# Altium schematic symbol library SCHLIB.SchLib: 2608 symbols (part 1 of 20) (continued)
## CAE-330UF-Radial-63V (continued)
CAP ALUM 330UF 20% 63V SMD; Manufacturer: Nichicon; Manufacturer Part Number: UUG1J331MNQ6MS; Ripple Current: 680mA; Life (Hours): 2000Hour; Leakage Current: 4uA; Washability: OK; Supplier 1: Digi-Key; Supplier Part Number 1: 493-7427-1-ND; Stock 1: 133; Pricing 1: 1=1.25000, 10=0.98600 (USD); RoHS: Yes; Mount: Surface Mount; Min Operating Temperature: -40°C; Max Operating Temperature: 85°C; Capacitance: 330uF; Package Quantity: 1; Packaging: Tape and Reel; Voltage Rating (DC): 63V; Tolerance: 20%; Termination: SMD/SMT; Length: 21mm; Height - Seated (Max): 0.866inch; ComponentLink1URL: https://datasheet.ciiva.com/6316/e-ug-6316181.pdf?src-supplier=Digi-Key; ComponentLink1Description: https://datasheet.ciiva.com/6316/e-ug-6316181.pdf?src-supplier=Digi-Key; ComponentLink2URL: https://datasheet.ciiva.com/6316/e-ug-6316175.pdf?src-supplier=Digi-Key; ComponentLink2Description: https://datasheet.ciiva.com/6316/e-ug-6316175.pdf?src-supplier=Digi-Key
footprint C-E-12.5X21L
pins: 1, 2
text: +

## CAE-680UF-RADIAL SMD
designator C?, comment 680UF  Voltage: 50V
CAP ALUM 680UF 20% 50V SMD; Manufacturer: Vishay BCcomponents; Manufacturer Part Number: MAL214699109E3; Ripple Current: 1.3A; Polarity: Polar; Leakage Current: 340uA; Life (Hours): 5000Hour; Impedance: 72mR; Lead Diameter: 1.3mm; ComponentLink1URL: http://www.farnell.com/datasheets/1800489.pdf; ComponentLink1Description: http://www.farnell.com/datasheets/1800489.pdf; ComponentLink2URL: http://components.arrow.com/part/dataview/41790773S9646858N1386; ComponentLink2Description: http://components.arrow.com/part/dataview/41790773S9646858N1386; ComponentLink3URL: http://nichicon-us.com/english/products/pdfs/e-ucl.pdf; ComponentLink3Description: http://nichicon-us.com/english/products/pdfs/e-ucl.pdf; ComponentLink4URL: http://www.farnell.com/datasheets/2059678.pdf; ComponentLink4Description: http://www.farnell.com/datasheets/2059678.pdf; ComponentLink5URL: http://uk.rs-online.com/webdocs/0df0/0900766b80df09a1.pdf; ComponentLink5Description: http://uk.rs-online.com/webdocs/0df0/0900766b80df09a1.pdf; ComponentLink6URL: http://www.farnell.com/datasheets/2244690.pdf; ComponentLink6Description: http://www.farnell.com/datasheets/2244690.pdf; ComponentLink7URL: https://www.alliedelec.com/m/d/f9a8f3530578bb19547681b1320b60ff.pdf; ComponentLink7Description: https://www.alliedelec.com/m/d/f9a8f3530578bb19547681b1320b60ff.pdf; ComponentLink8URL: http://industrial.panasonic.com/www-data/pdf/ABA0000/ABA0000CE114.pdf; ComponentLink8Description: http://industrial.panasonic.com/www-data/pdf/ABA0000/ABA0000CE114.pdf; ComponentLink9URL: https://www.distrelec.biz/Web/Downloads/_t/ds/fp_eng_tds.pdf?mime=application%2Fpdf; ComponentLink9Description: https://www.distrelec.biz/Web/Downloads/_t/ds/fp_eng_tds.pdf?mime=application%2Fpdf; Supplier 1: Arrow Electronics; Stock 1: 2400; Pricing 1: 600=1.58740, 900=1.54700, 1500=1.49630, 3000=1.45580, 4500=1.44550, 150=1.81500, 450=1.54600, 900=1.52090, 1500=1.47100, 3000=1.43100, 4500=1.42100, 1=2.68700, 10=2.61600, 25=2.49300 (USD); RoHS: Yes; Mount: Surface Mount,PCB; Case/Package: Radial; Min Operating Temperature: -55°C; Max Operating Temperature: 125°C; Capacitance: 680uF; Tolerance: 20%; Voltage Rating (DC): 50V; Termination: SMD/SMT; Package Quantity: 150; Voltage Rating: 50V; Packaging: Tape and Reel; Diameter: 16mm; Width: 16mm; Height: 16mm; Lead Pitch: 6.5mm; Height - Seated (Max): 0.63inch; Radiation Hardening: No; ComponentLink10URL: https://datasheet.ciiva.com/11782/0900766b81003e87-11782469.pdf?src-supplier=RSComponents; ComponentLink10Description: https://datasheet.ciiva.com/11782/0900766b81003e87-11782469.pdf?src-supplier=RSComponents; ComponentLink11URL: https://datasheet.ciiva.com/119/146cti-119936.pdf?src-supplier=Digi-Key; ComponentLink11Description: https://datasheet.ciiva.com/119/146cti-119936.pdf?src-supplier=Digi-Key; ComponentLink12URL: https://datasheet.ciiva.com/119/146cti-119934.pdf?src-supplier=Digi-Key; ComponentLink12Description: https://datasheet.ciiva.com/119/146cti-119934.pdf?src-supplier=Digi-Key; ComponentLink13URL: https://datasheet.ciiva.com/11697/146cti-11697685.pdf?src-supplier=Avnet; ComponentLink13Description: https://datasheet.ciiva.com/11697/146cti-11697685.pdf?src-supplier=Avnet; ComponentLink14URL: https://datasheet.ciiva.com/5360/146cti-247382-5360150.pdf?src-supplier=Mouser; ComponentLink14Description: https://datasheet.ciiva.com/5360/146cti-247382-5360150.pdf?src-supplier=Mouser; ComponentLink15URL: https://datasheet.ciiva.com/119/146cti-119935.pdf?src-supplier=Digi-Key; ComponentLink15Description: https://datasheet.ciiva.com/119/146cti-119935.pdf?src-supplier=Digi-Key; Supplier Part Number 1: MAL214699109E3
footprint C-E-16x16x17.5 (Aluminum Electrolytic Capacitor, Body 16.60x16.60x17.50mm, IPC Medium Density)
pins: 1, 2
text: +

## CAE-1000UF-16X27X7.5
designator C?, comment 1000UF  Case/Package: 16X27X7.5  Voltage: 63V
CAP ALUM 1000UF 20% 63V RADIAL; Manufacturer: Nichicon; Manufacturer Part Number: UVR1J102MHD; Dielectric Material: Aluminium; Capacitance: 1mF; Ripple Current: 1.3A; Life (Hours): 2000Hour; Leakage Current: 1.89mA; Dissipation Factor: 0.1%; Lead Diameter: 0.8mm; Washability: OK; Number of I/Os: 8; Supplier 1: Digi-Key; Stock 1: 14682; Pricing 1: 1=0.96, 10=0.759, 100=0.569, 500=0.42994, 1000=0.37935, 2500=0.35406, 5000=0.34142 (USD); Mount: PCB,Through Hole; Number of Pins: 2; Contact Plating: Matte,Tin; Min Operating Temperature: -40°C; Max Operating Temperature: 85°C; Tolerance: 20%; Voltage Rating (DC): 63V; Termination: Radial; Voltage Rating: 63V; Packaging: Bulk; Package Quantity: 50; Diameter: 16mm; Length: 25mm; Height: 25mm; Lead Pitch: 7.5mm; Height - Seated (Max): 0.984inch; Radiation Hardening: No; Lead Free: Lead Free; REACH SVHC: No SVHC; ComponentLink1URL: http://nichicon-us.com/english/products/pdfs/e-mi_tape.pdf?src-supplier=Digi-Key; ComponentLink1Description: http://nichicon-us.com/english/products/pdfs/e-mi_tape.pdf?src-supplier=Digi-Key; ComponentLink2URL: https://www.verical.com/server-webapp/html/getDatasheet?partID=72219&src-supplier=Verical; ComponentLink2Description: https://www.verical.com/server-webapp/html/getDatasheet?partID=72219&src-supplier=Verical; ComponentLink3URL: http://www.mouser.com/ds/2/293/e-uvr-1076495.pdf?src-supplier=Mouser; ComponentLink3Description: http://www.mouser.com/ds/2/293/e-uvr-1076495.pdf?src-supplier=Mouser; ComponentLink4URL: http://www.jameco.com/Jameco/Products/ProdDS/608964.pdf?src-supplier=Jameco; ComponentLink4Description: http://www.jameco.com/Jameco/Products/ProdDS/608964.pdf?src-supplier=Jameco; ComponentLink5URL: http://components.arrow.com/part/dataview/41714517S7196225N1432?src-supplier=Arrow; ComponentLink5Description: http://components.arrow.com/part/dataview/41714517S7196225N1432?src-supplier=Arrow; ComponentLink6URL: http://www.alliedelec.com/m/d/2079ee50b23aa24d1fe62a3e164465c7.pdf?src-supplier=Allied+Electronics; ComponentLink6Description: http://www.alliedelec.com/m/d/2079ee50b23aa24d1fe62a3e164465c7.pdf?src-supplier=Allied+Electronics; ComponentLink7URL: http://products.nichicon.co.jp/en/pdf/XJA043/e-vr.pdf?src-supplier=Future+Electronics; ComponentLink7Description: http://products.nichicon.co.jp/en/pdf/XJA043/e-vr.pdf?src-supplier=Future+Electronics; ComponentLink8URL: http://www.nichicon.co.jp/english/products/pdfs/e-vr.pdf?src-supplier=Avnet; ComponentLink8Description: http://www.nichicon.co.jp/english/products/pdfs/e-vr.pdf?src-supplier=Avnet; Supplier Part Number 1: 493-1129-ND; Stock: 1976; Pricing: 1=1.6, 10=1.428, 25=1.3552, 100=1.0406, 250=0.9196, 500=0.8712, 1000=0.6776 (USD); RoHS: No; ComponentLink9URL: http://www.ti.com/lit/ds/symlink/tca6408a-q1.pdf?src-supplier=Digi-Key; ComponentLink9Description: http://www.ti.com/lit/ds/symlink/tca6408a-q1.pdf?src-supplier=Digi-Key; ComponentLink10URL: http://www.ti.com/general/docs/suppproductinfo.tsp?distId=10&amp;gotoUrl=http%3A%2F%2Fwww.ti.com%2Flit%2Fgpn%2Ftca6408a-q1&src-supplier=Digi-Key; ComponentLink10Description: http://www.ti.com/general/docs/suppproductinfo.tsp?distId=10&amp;gotoUrl=http%3A%2F%2Fwww.ti.com%2Flit%2Fgpn%2Ftca6408a-q1&src-supplier=Digi-Key
footprint C-16X27X7.5
pins: 1, 2
text: +

## CAE-1000uF-RADIAL
designator C?, comment 1000uF  Voltage: 50V
CAP ALUM 1000UF 20% 50V SMD; Manufacturer: Cornell Dubilier; Manufacturer Part Number: AFK108M50P44T-F; Dielectric Material: Aluminium; Dissipation Factor: 0.1%; Capacitance: 1mF; Ripple Current: 1.61A; ESR (Equivalent Series Resistance): 73mR; Life (Hours): 5000Hour; Leakage Current: 500uA; Supplier 1: Digi-Key; Supplier Part Number 1: 338-2150-1-ND; Stock: 4964; Pricing: 1=2.9, 10=2.343, 50=2.0448 (USD); RoHS: Yes; Mount: Surface Mount; Case/Package: Radial; Number of Pins: 2; Min Operating Temperature: -55°C; Max Operating Temperature: 105°C; Tolerance: 20%; Packaging: Tape and Reel; Ripple Current (AC): 1.61A; Voltage Rating: 50V; Voltage Rating (DC): 50V; Package Quantity: 1; Impedance: 73mR; Termination: SMD/SMT; Diameter: 16mm; Length: 16.5mm; Height: 16.5mm; Lead Pitch: 6.7mm; Height - Seated (Max): 0.65inch; Radiation Hardening: No; Lead Free: Lead Free; REACH SVHC: No SVHC; ComponentLink1URL: https://datasheet.ciiva.com/100/afk-100025.pdf?src-supplier=Digi-Key; ComponentLink1Description: https://datasheet.ciiva.com/100/afk-100025.pdf?src-supplier=Digi-Key; ComponentLink2URL: https://datasheet.ciiva.com/100/afk-100026.pdf?src-supplier=Digi-Key; ComponentLink2Description: https://datasheet.ciiva.com/100/afk-100026.pdf?src-supplier=Digi-Key; ComponentLink3URL: https://datasheet.ciiva.com/28458/1856883-28458744.pdf?src-supplier=Element14; ComponentLink3Description: https://datasheet.ciiva.com/28458/1856883-28458744.pdf?src-supplier=Element14; ComponentLink4URL: https://datasheet.ciiva.com/100/afk-100027.pdf?src-supplier=Digi-Key; ComponentLink4Description: https://datasheet.ciiva.com/100/afk-100027.pdf?src-supplier=Digi-Key; ComponentLink5URL: https://datasheet.ciiva.com/8063/1856883-8063758.pdf?src-supplier=Element14; ComponentLink5Description: https://datasheet.ciiva.com/8063/1856883-8063758.pdf?src-supplier=Element14
pins: 1, 2
text: +

## CAE-1500UF-19X19X22MM
designator C?, comment 1500UF  Case/Package: 19X19X22  Voltage Rating: 50V
CAP ALUM 1500UF 20% 50V SMD; Manufacturer: Rubycon; Manufacturer Part Number: 50TRV1500M18X21.5; Capacitance: 1.5mF; Polarity: Polar; Ripple Current: 990mA; Impedance: 72mR; Life (Hours): 10000Hour; Ripple Current (AC): 1.65A; Washability: OK; Supplier 1: Digi-Key; Stock 1: 4100; Pricing 1: 1=3.73, 10=3.01 (USD); Mount: Surface Mount; Min Operating Temperature: -40°C; Max Operating Temperature: 105°C; Packaging: Cut Tape; ESR (Equivalent Series Resistance): 72mR; Tolerance: 20%; Voltage Rating (DC): 50V; Diameter: 18mm; Height: 21.5mm; Height - Seated (Max): 0.866inch; REACH SVHC: Unknown; Supplier Part Number 1: 1189-3575-6-ND
pins: 1, 2
text: +

## CAE-2200UF-RADIAL TH
designator C?, comment 2200UF  Case/Package: Radial  Voltage Rating: 63V
CAP ALUM 2200UF 63V 20% RADIAL; Manufacturer: Nichicon; Manufacturer Part Number: UVK1J222MHD; Capacitance: 2.2mF; Ripple Current: 2.3A; Leakage Current: 4.158mA; Life (Hours): 2000Hour; Lead Diameter: 0.8mm; Dielectric Material: Aluminium; Dissipation Factor: 0.1%; Washability: OK; ComponentLink1URL: http://www.nichicon.co.jp/english/products/pdfs/e-vr.pdf; ComponentLink1Description: http://www.nichicon.co.jp/english/products/pdfs/e-vr.pdf; ComponentLink2URL: http://nichicon-us.com/english/products/pdfs/e-mi_tape.pdf; ComponentLink2Description: http://nichicon-us.com/english/products/pdfs/e-mi_tape.pdf; ComponentLink3URL: http://components.arrow.com/part/dataview/41714523S7264371N1432; ComponentLink3Description: http://components.arrow.com/part/dataview/41714523S7264371N1432; ComponentLink4URL: http://www.alliedelec.com/m/d/2079ee50b23aa24d1fe62a3e164465c7.pdf; ComponentLink4Description: http://www.alliedelec.com/m/d/2079ee50b23aa24d1fe62a3e164465c7.pdf; ComponentLink5URL: http://products.nichicon.co.jp/en/pdf/XJA043/e-vr.pdf; ComponentLink5Description: http://products.nichicon.co.jp/en/pdf/XJA043/e-vr.pdf; ComponentLink6URL: https://www.verical.com/server-webapp/html/getDatasheet?partID=54724; ComponentLink6Description: https://www.verical.com/server-webapp/html/getDatasheet?partID=54724; Supplier 1: Digi-Key; Supplier Part Number 1: 493-12411-ND; Stock 1: 393; Pricing 1: 1=2.11, 10=1.705, 100=1.3023, 500=0.9922, 1000=0.86818, 2500=0.83718, 5000=0.80617 (USD); Mount: Through Hole; Min Operating Temperature: -40°C; Max Operating Temperature: 85°C; Tolerance: 20%; Packaging: Bulk; Package Quantity: 50; Voltage Rating (DC): 63V; Termination: Radial; Features: General Purpose; Diameter: 18mm; Length: 35.5mm; Height: 35.5mm; Lead Pitch: 7.5mm; Height - Seated (Max): 1.476inch; Radiation Hardening: No; ComponentLink7URL: http://www.nichicon.co.jp/english/products/pdfs/e-vk.pdf; ComponentLink7Description: http://www.nichicon.co.jp/english/products/pdfs/e-vk.pdf; ComponentLink8URL: http://www.mouser.com/ds/2/293/e-uvk-880083.pdf; ComponentLink8Description: http://www.mouser.com/ds/2/293/e-uvk-880083.pdf; Supplier 2: Digi-Key; Supplier Part Number 2: 493-1130-ND; Stock 2: 148; Pricing 2: 1=2.06, 10=1.663, 100=1.2703, 500=0.96784, 1000=0.84687, 2500=0.81662, 5000=0.78638 (USD); Weight: 0.01lb; Contact Plating: Matte,Tin; Voltage: 63V; Width: 0.75inch; REACH SVHC: No SVHC; Lead Free: Lead Free
pins: 1, 2
text: +

## CAP-100U-SMD-10.3X10.3
designator C?, comment 100U  Case/Package: Radial  Voltage Rating: 50V
CAP ALUM POLY 100UF 20% 50V SMD; Manufacturer: Panasonic; Manufacturer Part Number: EEHZA1H101V; ESR (Equivalent Series Resistance): 28mR; Life (Hours): 10000Hour; Washability: OK; ComponentLink1URL: http://www.farnell.com/datasheets/2368699.pdf?src-supplier=Farnell; ComponentLink1Description: http://www.farnell.com/datasheets/2368699.pdf?src-supplier=Farnell; ComponentLink2URL: http://nichicon-us.com/english/products/pdfs/e-gya.pdf?src-supplier=Digi-Key; ComponentLink2Description: http://nichicon-us.com/english/products/pdfs/e-gya.pdf?src-supplier=Digi-Key; Supplier 1: Digi-Key; Supplier Part Number 1: P19827CT-ND; Stock 1: 4062; Pricing 1: 1=2.22000, 10=1.79500, 100=1.37050 (USD); RoHS: Yes; Mount: Surface Mount; Min Operating Temperature: -55°C; Max Operating Temperature: 105°C; Composition: Hybrid; Packaging: Tape and Reel; Capacitance: 100uF; Tolerance: 20%; Ratings: AEC-Q200; ComponentLink3URL: https://industrial.panasonic.com/cdbs/www-data/pdf/RDD0000/ABA0000C1221.pdf?src-supplier=Digi-Key; ComponentLink3Description: https://industrial.panasonic.com/cdbs/www-data/pdf/RDD0000/ABA0000C1221.pdf?src-supplier=Digi-Key
footprint C-E-10.3x10.3x10.5
pins: 1, 2
text: +

## CC-0.1pF-0402-50V-±0.1pF%
designator C?, comment Voltage - Rated: 50V  Package: 0402  (hidden comment: 0.1pF)
CAP CER 0.1PF 50V NP0 0402; Manufacturer Part Number: GCM1555C1HR10BA16D; Manufacturer: Murata Electronics; Temperature Coefficient: C0G; Object  Type: Part; Design Item ID: CC-0.1pF-0402-50V-±0.1pF%; Series: GCM; Tolerance: ±0.1pF; Operating Temperature: -55°C ~ 125°C; Features: -; Ratings: AEC-Q200; Applications: Automotive; Failure Rate: -; Mounting Type: Surface Mount, MLCC; Size: 1.00mm x 0.50mm; Height: -; Thickness: 0.55mm; Category: Capacitor; Value: 0.1pF
footprint CC0402
pins: 1, 2

## CC-0.8pF-0402-50V-±0.1pF
designator C?, comment Voltage - Rated: 50V  Package: 0402  (hidden comment: 0.8pF)
CAP CER 0.8PF 50V NP0 0402; Manufacturer Part Number: GCM1555C1HR80BA16D; Manufacturer: Murata Electronics; Tolerance: ±0.1pF; Temperature Coefficient: C0G; Object  Type: Part; Design Item ID: CC-0.8pF-0402-50V-±0.1pF; Series: GCM; Operating Temperature: -55°C ~ 125°C; Features: -; Ratings: AEC-Q200; Applications: Automotive; Failure Rate: -; Mounting Type: Surface Mount, MLCC; Size: 1.00mm x 0.50mm; Height: -; Thickness: 0.55mm; Category: Capacitor; Value: 0.8pF
footprint CC0402
pins: 1, 2

## CC-1.2nF-0402-50V-±10%
designator C?, comment Voltage - Rated: 50V  Package: 0402  (hidden comment: 1.2nF)
CAP CER 1200PF 50V X7R 0402; Manufacturer Part Number: GCM155R71H122KA37D; Manufacturer: Murata Electronics; Tolerance: ±10%; Temperature Coefficient: C0G; Object  Type: Part; Design Item ID: CC-1.2nF-0402-50V-±10%; Series: GCM; Operating Temperature: -55°C ~ 125°C; Features: -; Ratings: AEC-Q200; Applications: Automotive; Failure Rate: -; Mounting Type: Surface Mount, MLCC; Size: 1.00mm x 0.50mm; Height: -; Thickness: 0.55mm; Category: Capacitor; Value: 1.2nF
footprint CC0402
pins: 1, 2

## CC-1.2nF-0603-50V-±1%
designator C?, comment Voltage - Rated: 50V  Package: 0603  (hidden comment: 1.2nF)
CAP CER 1200PF 100V C0G/NP0 0603; Manufacturer Part Number: GCM1885C1H122FA16D; Manufacturer: Murata Electronics; Tolerance: ±1%; Temperature Coefficient: C0G; Object  Type: Part; Design Item ID: CC-1.2nF-0603-50V-±1%; Series: GCM; Operating Temperature: -55°C ~ 125°C; Features: -; Ratings: AEC-Q200; Applications: Automotive; Failure Rate: -; Mounting Type: Surface Mount, MLCC; Size: 1.60mm x 0.80mm; Height: -; Thickness: 0.90mm; Category: Capacitor; Value: 1.2nF
footprint CC0603
pins: 1, 2

## CC-1.2pF-0402-50V-±0.1pF
designator C?, comment Voltage - Rated: 50V  Package: 0402  (hidden comment: 1.2pF)
CAP CER 1.2PF 50V C0G/NP0 0402; Manufacturer Part Number: GCM1555C1H1R2BA16D; Manufacturer: Murata Electronics; Tolerance: ±0.1pF; Temperature Coefficient: C0G; Object  Type: Part; Design Item ID: CC-1.2pF-0402-50V-±0.1pF; Series: GCM; Operating Temperature: -55°C ~ 125°C; Features: -; Ratings: AEC-Q200; Applications: Automotive; Failure Rate: -; Mounting Type: Surface Mount, MLCC; Size: 1.00mm x 0.50mm; Height: -; Thickness: 0.55mm; Category: Capacitor; Value: 1.2pF
footprint CC0402
pins: 1, 2

## CC-1.5nF-0402-50V-±10%
designator C?, comment Voltage - Rated: 50V  Package: 0402  (hidden comment: 1.5nF)
CAP CER 1500PF 50V X7R 0402; Manufacturer Part Number: GCM155R71H152KA37D; Manufacturer: Murata Electronics; Tolerance: ±10%; Temperature Coefficient: C0G; Object  Type: Part; Design Item ID: CC-1.5nF-0402-50V-±10%; Series: GCM; Operating Temperature: -55°C ~ 125°C; Features: -; Ratings: AEC-Q200; Applications: Automotive; Failure Rate: -; Mounting Type: Surface Mount, MLCC; Size: 1.00mm x 0.50mm; Height: -; Thickness: 0.55mm; Category: Capacitor; Value: 1.5nF
footprint CC0402
pins: 1, 2

## CC-1.5nF-0603-50V-±1%
designator C?, comment Voltage - Rated: 50V  Package: 0603  (hidden comment: 1.5nF)
CAP CER 1500PF 50V C0G/NP0 0603; Manufacturer Part Number: GCM1885C1H152FA16D; Manufacturer: Murata Electronics; Tolerance: ±1%; Temperature Coefficient: C0G; Object  Type: Part; Design Item ID: CC-1.5nF-0603-50V-±1%; Series: GCM; Operating Temperature: -55°C ~ 125°C; Features: -; Ratings: AEC-Q200; Applications: Automotive; Failure Rate: -; Mounting Type: Surface Mount, MLCC; Size: 1.60mm x 0.80mm; Height: -; Thickness: 0.90mm; Category: Capacitor; Value: 1.5nF
footprint CC0603
pins: 1, 2

## CC-1.5pF-0402-50V-±0.1pF
designator C?, comment Voltage - Rated: 50V  Package: 0402  (hidden comment: 1.5pF)
CAP CER 1.5PF 50V C0G/NP0 0402; Manufacturer Part Number: GCM1555C1H1R5BA16D; Manufacturer: Murata Electronics; Tolerance: ±0.1pF; Temperature Coefficient: C0G; Object  Type: Part; Design Item ID: CC-1.5pF-0402-50V-±0.1pF; Series: GCM; Operating Temperature: -55°C ~ 125°C; Features: -; Ratings: AEC-Q200; Applications: Automotive; Failure Rate: -; Mounting Type: Surface Mount, MLCC; Size: 1.00mm x 0.50mm; Height: -; Thickness: 0.55mm; Category: Capacitor; Value: 1.5pF
footprint CC0402
pins: 1, 2

## CC-1.5pF-0402-50V-±5%
designator C?, comment Voltage - Rated: 50V  Package: 0402  (hidden comment: 1.5pF)
CAP CER 1.5PF 50V C0G/NP0 0402; Manufacturer Part Number: GCM1555C1H1R5JA16D; Manufacturer: Murata Electronics; Tolerance: ±5%; Temperature Coefficient: C0G; Object  Type: Part; Design Item ID: CC-1.5pF-0402-50V-±5%; Series: GCM; Operating Temperature: -55°C ~ 125°C; Features: -; Ratings: AEC-Q200; Applications: Automotive; Failure Rate: -; Mounting Type: Surface Mount, MLCC; Size: 1.00mm x 0.50mm; Height: -; Thickness: 0.55mm; Category: Capacitor; Value: 1.5pF
footprint CC0402
pins: 1, 2

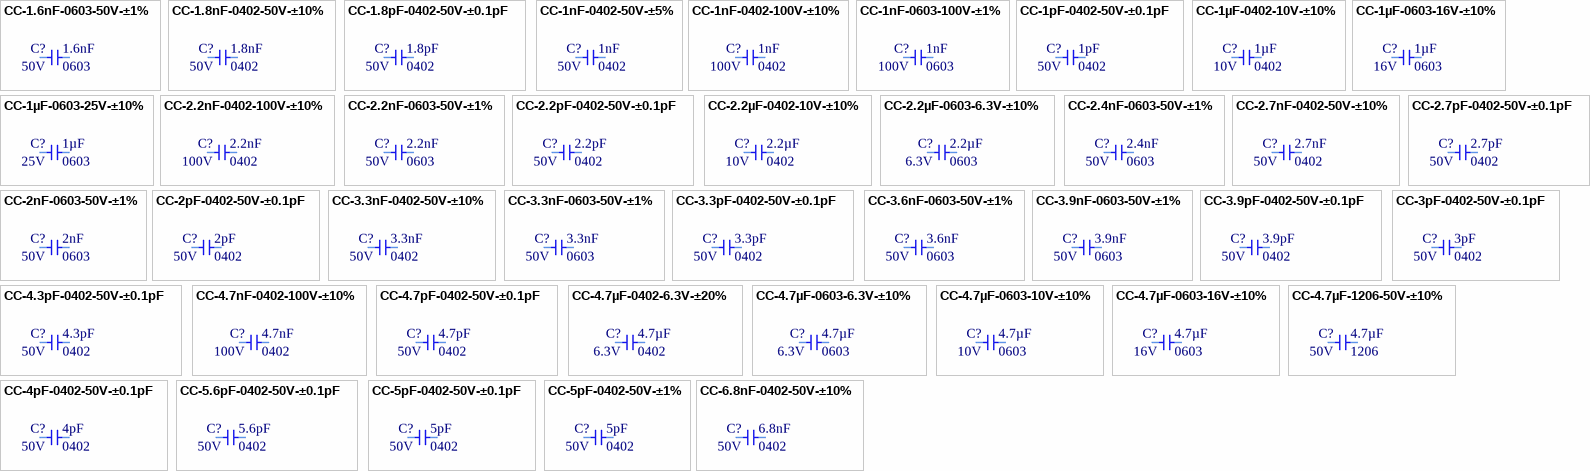
[diagram p1: symbols CC-1.6nF-0603-50V-±1% to CC-6.8nF-0402-50V-±10%]

## CC-1.6nF-0603-50V-±1%
designator C?, comment Voltage - Rated: 50V  Package: 0603  (hidden comment: 1.6nF)
CAP CER 1600PF 50V C0G/NP0 0603; Manufacturer Part Number: GCM1885C1H162FA16D; Manufacturer: Murata Electronics; Tolerance: ±1%; Temperature Coefficient: C0G; Object  Type: Part; Design Item ID: CC-1.6nF-0603-50V-±1%; Series: GCM; Operating Temperature: -55°C ~ 125°C; Features: -; Ratings: AEC-Q200; Applications: Automotive; Failure Rate: -; Mounting Type: Surface Mount, MLCC; Size: 1.60mm x 0.80mm; Height: -; Thickness: 0.90mm; Category: Capacitor; Value: 1.6nF
footprint CC0603
pins: 1, 2

## CC-1.8nF-0402-50V-±10%
designator C?, comment Voltage - Rated: 50V  Package: 0402  (hidden comment: 1.8nF)
CAP CER 1800PF 50V X7R 0402; Manufacturer Part Number: GCM155R71H182KA37D; Manufacturer: Murata Electronics; Tolerance: ±10%; Temperature Coefficient: C0G; Object  Type: Part; Design Item ID: CC-1.8nF-0402-50V-±10%; Series: GCM; Operating Temperature: -55°C ~ 125°C; Features: -; Ratings: AEC-Q200; Applications: Automotive; Failure Rate: -; Mounting Type: Surface Mount, MLCC; Size: 1.00mm x 0.50mm; Height: -; Thickness: 0.55mm; Category: Capacitor; Value: 1.8nF
footprint CC0402
pins: 1, 2

## CC-1.8pF-0402-50V-±0.1pF
designator C?, comment Voltage - Rated: 50V  Package: 0402  (hidden comment: 1.8pF)
CAP CER 1.8PF 50V C0G/NP0 0402; Manufacturer Part Number: GCM1555C1H1R8BA16D; Manufacturer: Murata Electronics; Tolerance: ±0.1pF; Temperature Coefficient: C0G; Object  Type: Part; Design Item ID: CC-1.8pF-0402-50V-±0.1pF; Series: GCM; Operating Temperature: -55°C ~ 125°C; Features: -; Ratings: AEC-Q200; Applications: Automotive; Failure Rate: -; Mounting Type: Surface Mount, MLCC; Size: 1.00mm x 0.50mm; Height: -; Thickness: 0.55mm; Category: Capacitor; Value: 1.8pF
footprint CC0402
pins: 1, 2

## CC-1nF-0402-50V-±5%
designator C?, comment Voltage - Rated: 50V  Package: 0402  (hidden comment: 1nF)
CAP CER 1000PF 50V C0G/NP0 0402; Manufacturer Part Number: GCM1555C1H102JA16J; Manufacturer: Murata Electronics; Tolerance: ±5%; Temperature Coefficient: C0G; Object  Type: Part; Design Item ID: CC-1nF-0402-50V-±5%; Series: GCM; Operating Temperature: -55°C ~ 125°C; Features: -; Ratings: AEC-Q200; Applications: Automotive; Failure Rate: -; Mounting Type: Surface Mount, MLCC; Size: 1.00mm x 0.50mm; Height: -; Thickness: 0.55mm; Category: Capacitor; Value: 1nF
footprint CC0402
pins: 1, 2

## CC-1nF-0402-100V-±10%
designator C?, comment Voltage - Rated: 100V  Package: 0402  (hidden comment: 1nF)
CAP CER 1000PF 100V X7R 0402; Manufacturer Part Number: GCM155R72A102KA37D; Manufacturer: Murata Electronics; Tolerance: ±10%; Temperature Coefficient: C0G; Object  Type: Part; Design Item ID: CC-1nF-0402-100V-±10%; Series: GCM; Operating Temperature: -55°C ~ 125°C; Features: -; Ratings: AEC-Q200; Applications: Automotive; Failure Rate: -; Mounting Type: Surface Mount, MLCC; Size: 1.00mm x 0.50mm; Height: -; Thickness: 0.55mm; Category: Capacitor; Value: 1nF
footprint CC0402
pins: 1, 2

## CC-1nF-0603-100V-±1%
designator C?, comment Voltage - Rated: 100V  Package: 0603  (hidden comment: 1nF)
CAP CER 1000PF 100V C0G/NP0 0603; Manufacturer Part Number: GCM1885C2A102FA16D; Manufacturer: Murata Electronics; Tolerance: ±1%; Temperature Coefficient: C0G; Object  Type: Part; Design Item ID: CC-1nF-0603-100V-±1%; Series: GCM; Operating Temperature: -55°C ~ 125°C; Features: -; Ratings: AEC-Q200; Applications: Automotive; Failure Rate: -; Mounting Type: Surface Mount, MLCC; Size: 1.60mm x 0.80mm; Height: -; Thickness: 0.90mm; Category: Capacitor; Value: 1nF
footprint CC0603
pins: 1, 2

## CC-1pF-0402-50V-±0.1pF
designator C?, comment Voltage - Rated: 50V  Package: 0402  (hidden comment: 1pF)
CAP CER 1PF 50V C0G/NP0 0402; Manufacturer Part Number: GCM1555C1H1R0BA16D; Manufacturer: Murata Electronics; Tolerance: ±0.1pF; Temperature Coefficient: C0G; Object  Type: Part; Design Item ID: CC-1pF-0402-50V-±0.1pF; Series: GCM; Operating Temperature: -55°C ~ 125°C; Features: -; Ratings: AEC-Q200; Applications: Automotive; Failure Rate: -; Mounting Type: Surface Mount, MLCC; Size: 1.00mm x 0.50mm; Height: -; Thickness: 0.55mm; Category: Capacitor; Value: 1pF
footprint CC0402
pins: 1, 2

## CC-1µF-0402-10V-±10%
designator C?, comment Voltage - Rated: 10V  Package: 0402  (hidden comment: 1µF)
CAP CER 1UF 10V X7S 0402; Manufacturer Part Number: GCM155C71A105KE38D; Manufacturer: Murata Electronics; Tolerance: ±10%; Temperature Coefficient: C0G; Object  Type: Part; Design Item ID: CC-1µF-0402-10V-±10%; Series: GCM; Operating Temperature: -55°C ~ 125°C; Features: -; Ratings: AEC-Q200; Applications: Automotive; Failure Rate: -; Mounting Type: Surface Mount, MLCC; Size: 1.00mm x 0.50mm; Height: -; Thickness: 0.55mm; Category: Capacitor; Value: 1µF
footprint CC0402
pins: 1, 2

## CC-1µF-0603-16V-±10%
designator C?, comment Voltage - Rated: 16V  Package: 0603  (hidden comment: 1µF)
CAP CER 1UF 16V X7R 0603; Manufacturer Part Number: GCM188R71C105KA64D; Manufacturer: Murata Electronics; Tolerance: ±10%; Object  Type: Part; Design Item ID: CC-1µF-0603-16V-±10%; Series: GCM; Temperature Coefficient: X7R; Operating Temperature: -55°C ~ 125°C; Features: -; Ratings: AEC-Q200; Applications: Automotive; Failure Rate: -; Mounting Type: Surface Mount, MLCC; Size: 1.60mm x 0.80mm; Height: -; Thickness: 0.90mm; Category: Capacitor; Value: 1µF
footprint CC0603
pins: 1, 2

## CC-1µF-0603-25V-±10%
designator C?, comment Voltage - Rated: 25V  Package: 0603  (hidden comment: 1µF)
CAP CER 1UF 25V X7R 0603; Manufacturer Part Number: GCM188R71E105KA64D; Manufacturer: Murata Electronics; Tolerance: ±10%; Object  Type: Part; Design Item ID: CC-1µF-0603-25V-±10%; Series: GCM; Temperature Coefficient: X7R; Operating Temperature: -55°C ~ 125°C; Features: -; Ratings: AEC-Q200; Applications: Automotive; Failure Rate: -; Mounting Type: Surface Mount, MLCC; Size: 1.60mm x 0.80mm; Height: -; Thickness: 0.90mm; Category: Capacitor; Value: 1µF
footprint CC0603
pins: 1, 2

## CC-2.2nF-0402-100V-±10%
designator C?, comment Voltage - Rated: 100V  Package: 0402  (hidden comment: 2.2nF)
CAP CER 2200PF 100V X7R 0402; Manufacturer Part Number: GCM155R72A222KA37D; Manufacturer: Murata Electronics; Tolerance: ±10%; Temperature Coefficient: C0G; Object  Type: Part; Design Item ID: CC-2.2nF-0402-100V-±10%; Series: GCM; Value: 2.2nF; Operating Temperature: -55°C ~ 125°C; Features: -; Ratings: AEC-Q200; Applications: Automotive; Failure Rate: -; Mounting Type: Surface Mount, MLCC; Size: 1.00mm x 0.50mm; Height: -; Thickness: 0.55mm; Category: Capacitor
footprint CC0402
pins: 1, 2

## CC-2.2nF-0603-50V-±1%
designator C?, comment Voltage - Rated: 50V  Package: 0603  (hidden comment: 2.2nF)
CAP CER 2200PF 50V C0G/NP0 0603; Manufacturer Part Number: GCM1885C1H222FA16D; Manufacturer: Murata Electronics; Tolerance: ±1%; Temperature Coefficient: C0G; Object  Type: Part; Design Item ID: CC-2.2nF-0603-50V-±1%; Series: GCM; Operating Temperature: -55°C ~ 125°C; Features: -; Ratings: AEC-Q200; Applications: Automotive; Failure Rate: -; Mounting Type: Surface Mount, MLCC; Size: 1.60mm x 0.80mm; Height: -; Thickness: 0.90mm; Category: Capacitor; Value: 2.2nF
footprint CC0603
pins: 1, 2

## CC-2.2pF-0402-50V-±0.1pF
designator C?, comment Voltage - Rated: 50V  Package: 0402  (hidden comment: 2.2pF)
CAP CER 2.2PF 50V C0G/NP0 0402; Manufacturer Part Number: GCM1555C1H2R2BA16D; Manufacturer: Murata Electronics; Tolerance: ±0.1pF; Temperature Coefficient: C0G; Object  Type: Part; Design Item ID: CC-2.2pF-0402-50V-±0.1pF; Series: GCM; Operating Temperature: -55°C ~ 125°C; Features: -; Ratings: AEC-Q200; Applications: Automotive; Failure Rate: -; Mounting Type: Surface Mount, MLCC; Size: 1.00mm x 0.50mm; Height: -; Thickness: 0.55mm; Category: Capacitor; Value: 2.2pF
footprint CC0402
pins: 1, 2

## CC-2.2µF-0402-10V-±10%
designator C?, comment Voltage - Rated: 10V  Package: 0402  (hidden comment: 2.2µF)
CAP CER 2.2UF 10V X5R 0402; Manufacturer Part Number: LMK105ABJ225KVHF; Manufacturer: Taiyo Yuden; Tolerance: ±10%; Temperature Coefficient: C0G; Object  Type: Part; Design Item ID: CC-2.2µF-0402-10V-±10%; Series: M; Operating Temperature: -55°C ~ 85°C; Features: -; Ratings: AEC-Q200; Applications: Automotive; Failure Rate: -; Mounting Type: Surface Mount, MLCC; Size: 1.00mm x 0.50mm; Height: -; Thickness: 0.60mm; Category: Capacitor; Value: 2.2µF
footprint CC0402
pins: 1, 2

## CC-2.2µF-0603-6.3V-±10%
designator C?, comment Voltage - Rated: 6.3V  Package: 0603  (hidden comment: 2.2µF)
CAP CER 2.2UF 6.3V X7R 0603; Manufacturer Part Number: GCM188R70J225KE22D; Manufacturer: Murata Electronics; Tolerance: ±10%; Object  Type: Part; Design Item ID: CC-2.2µF-0603-6.3V-±10%; Series: GCM; Temperature Coefficient: X7R; Operating Temperature: -55°C ~ 125°C; Features: -; Ratings: AEC-Q200; Applications: Automotive; Failure Rate: -; Mounting Type: Surface Mount, MLCC; Size: 1.60mm x 0.80mm; Height: -; Thickness: 0.90mm; Category: Capacitor; Value: 2.2µF
footprint CC0603
pins: 1, 2

## CC-2.4nF-0603-50V-±1%
designator C?, comment Voltage - Rated: 50V  Package: 0603  (hidden comment: 2.4nF)
CAP CER 2400PF 50V C0G/NP0 0603; Manufacturer Part Number: GCM1885C1H242FA16J; Manufacturer: Murata Electronics; Tolerance: ±1%; Temperature Coefficient: C0G; Object  Type: Part; Design Item ID: CC-2.4nF-0603-50V-±1%; Series: GCM; Operating Temperature: -55°C ~ 125°C; Features: -; Ratings: AEC-Q200; Applications: Automotive; Failure Rate: -; Mounting Type: Surface Mount, MLCC; Size: 1.60mm x 0.80mm; Height: -; Thickness: 0.90mm; Category: Capacitor; Value: 2.4nF
footprint CC0603
pins: 1, 2

## CC-2.7nF-0402-50V-±10%
designator C?, comment Voltage - Rated: 50V  Package: 0402  (hidden comment: 2.7nF)
CAP CER 2700PF 50V X7R 0402; Manufacturer Part Number: GCM155R71H272KA37D; Manufacturer: Murata Electronics; Tolerance: ±10%; Temperature Coefficient: C0G; Object  Type: Part; Design Item ID: CC-2.7nF-0402-50V-±10%; Series: GCM; Operating Temperature: -55°C ~ 125°C; Features: -; Ratings: AEC-Q200; Applications: Automotive; Failure Rate: -; Mounting Type: Surface Mount, MLCC; Size: 1.00mm x 0.50mm; Height: -; Thickness: 0.55mm; Category: Capacitor; Value: 2.7nF
footprint CC0402
pins: 1, 2

## CC-2.7pF-0402-50V-±0.1pF
designator C?, comment Voltage - Rated: 50V  Package: 0402  (hidden comment: 2.7pF)
CAP CER 2.7PF 50V C0G/NP0 0402; Manufacturer Part Number: GCM1555C1H2R7BA16D; Manufacturer: Murata Electronics; Tolerance: ±0.1pF; Temperature Coefficient: C0G; Object  Type: Part; Design Item ID: CC-2.7pF-0402-50V-±0.1pF; Series: GCM; Operating Temperature: -55°C ~ 125°C; Features: -; Ratings: AEC-Q200; Applications: Automotive; Failure Rate: -; Mounting Type: Surface Mount, MLCC; Size: 1.00mm x 0.50mm; Height: -; Thickness: 0.55mm; Category: Capacitor; Value: 2.7pF
footprint CC0402
pins: 1, 2

## CC-2nF-0603-50V-±1%
designator C?, comment Voltage - Rated: 50V  Package: 0603  (hidden comment: 2nF)
CAP CER 2000PF 50V C0G/NP0 0603; Manufacturer Part Number: GCM1885C1H202FA16J; Manufacturer: Murata Electronics; Tolerance: ±1%; Temperature Coefficient: C0G; Object  Type: Part; Design Item ID: CC-2nF-0603-50V-±1%; Series: GCM; Operating Temperature: -55°C ~ 125°C; Features: -; Ratings: AEC-Q200; Applications: Automotive; Failure Rate: -; Mounting Type: Surface Mount, MLCC; Size: 1.60mm x 0.80mm; Height: -; Thickness: 0.90mm; Category: Capacitor; Value: 2nF
footprint CC0603
pins: 1, 2

## CC-2pF-0402-50V-±0.1pF
designator C?, comment Voltage - Rated: 50V  Package: 0402  (hidden comment: 2pF)
CAP CER 2PF 50V C0G/NP0 0402; Manufacturer Part Number: GCM1555C1H2R0BA16D; Manufacturer: Murata Electronics; Tolerance: ±0.1pF; Temperature Coefficient: C0G; Object  Type: Part; Design Item ID: CC-2pF-0402-50V-±0.1pF; Series: GCM; Value: 2pF; Operating Temperature: -55°C ~ 125°C; Features: -; Ratings: AEC-Q200; Applications: Automotive; Failure Rate: -; Mounting Type: Surface Mount, MLCC; Size: 1.00mm x 0.50mm; Height: -; Thickness: 0.55mm; Category: Capacitor
footprint CC0402
pins: 1, 2

## CC-3.3nF-0402-50V-±10%
designator C?, comment Voltage - Rated: 50V  Package: 0402  (hidden comment: 3.3nF)
CAP CER 3300PF 50V X7R 0402; Manufacturer Part Number: GCM155R71H332KA37D; Manufacturer: Murata Electronics; Tolerance: ±10%; Temperature Coefficient: C0G; Object  Type: Part; Design Item ID: CC-3.3nF-0402-50V-±10%; Series: GCM; Operating Temperature: -55°C ~ 125°C; Features: -; Ratings: AEC-Q200; Applications: Automotive; Failure Rate: -; Mounting Type: Surface Mount, MLCC; Size: 1.00mm x 0.50mm; Height: -; Thickness: 0.55mm; Category: Capacitor; Value: 3.3nF
footprint CC0402
pins: 1, 2

## CC-3.3nF-0603-50V-±1%
designator C?, comment Voltage - Rated: 50V  Package: 0603  (hidden comment: 3.3nF)
CAP CER 3300PF 50V C0G/NP0 0603; Manufacturer Part Number: GCM1885C1H332FA16D; Manufacturer: Murata Electronics; Tolerance: ±1%; Temperature Coefficient: C0G; Object  Type: Part; Design Item ID: CC-3.3nF-0603-50V-±1%; Series: GCM; Operating Temperature: -55°C ~ 125°C; Features: -; Ratings: AEC-Q200; Applications: Automotive; Failure Rate: -; Mounting Type: Surface Mount, MLCC; Size: 1.60mm x 0.80mm; Height: -; Thickness: 0.90mm; Category: Capacitor; Value: 3.3nF
footprint CC0603
pins: 1, 2

## CC-3.3pF-0402-50V-±0.1pF
designator C?, comment Voltage - Rated: 50V  Package: 0402  (hidden comment: 3.3pF)
CAP CER 3.3PF 50V C0G/NP0 0402; Manufacturer Part Number: GCM1555C1H3R3BA16D; Manufacturer: Murata Electronics; Tolerance: ±0.1pF; Temperature Coefficient: C0G; Object  Type: Part; Design Item ID: CC-3.3pF-0402-50V-±0.1pF; Series: GCM; Operating Temperature: -55°C ~ 125°C; Features: -; Ratings: AEC-Q200; Applications: Automotive; Failure Rate: -; Mounting Type: Surface Mount, MLCC; Size: 1.00mm x 0.50mm; Height: -; Thickness: 0.55mm; Category: Capacitor; Value: 3.3pF
footprint CC0402
pins: 1, 2

## CC-3.6nF-0603-50V-±1%
designator C?, comment Voltage - Rated: 50V  Package: 0603  (hidden comment: 3.6nF)
CAP CER 3600PF 50V C0G/NP0 0603; Manufacturer Part Number: GCM1885C1H362FA16J; Manufacturer: Murata Electronics; Tolerance: ±1%; Temperature Coefficient: C0G; Object  Type: Part; Design Item ID: CC-3.6nF-0603-50V-±1%; Series: GCM; Operating Temperature: -55°C ~ 125°C; Features: -; Ratings: AEC-Q200; Applications: Automotive; Failure Rate: -; Mounting Type: Surface Mount, MLCC; Size: 1.60mm x 0.80mm; Height: -; Thickness: 0.90mm; Category: Capacitor; Value: 3.6nF
footprint CC0603
pins: 1, 2

## CC-3.9nF-0603-50V-±1%
designator C?, comment Voltage - Rated: 50V  Package: 0603  (hidden comment: 3.9nF)
CAP CER 3900PF 50V C0G/NP0 0603; Manufacturer Part Number: GCM1885C1H392FA16J; Manufacturer: Murata Electronics; Tolerance: ±1%; Temperature Coefficient: C0G; Object  Type: Part; Design Item ID: CC-3.9nF-0603-50V-±1%; Series: GCM; Operating Temperature: -55°C ~ 125°C; Features: -; Ratings: AEC-Q200; Applications: Automotive; Failure Rate: -; Mounting Type: Surface Mount, MLCC; Size: 1.60mm x 0.80mm; Height: -; Thickness: 0.90mm; Category: Capacitor; Value: 3.9nF
footprint CC0603
pins: 1, 2

## CC-3.9pF-0402-50V-±0.1pF
designator C?, comment Voltage - Rated: 50V  Package: 0402  (hidden comment: 3.9pF)
CAP CER 3.9PF 50V C0G/NP0 0402; Manufacturer Part Number: GCM1555C1H3R9BA16D; Manufacturer: Murata Electronics; Tolerance: ±0.1pF; Temperature Coefficient: C0G; Object  Type: Part; Design Item ID: CC-3.9pF-0402-50V-±0.1pF; Series: GCM; Value: 3.9pF; Operating Temperature: -55°C ~ 125°C; Features: -; Ratings: AEC-Q200; Applications: Automotive; Failure Rate: -; Mounting Type: Surface Mount, MLCC; Size: 1.00mm x 0.50mm; Height: -; Thickness: 0.55mm; Category: Capacitor
footprint CC0402
pins: 1, 2

## CC-3pF-0402-50V-±0.1pF
designator C?, comment Voltage - Rated: 50V  Package: 0402  (hidden comment: 3pF)
CAP CER 3PF 50V C0G/NP0 0402; Manufacturer Part Number: GCM1555C1H3R0BA16D; Manufacturer: Murata Electronics; Tolerance: ±0.1pF; Temperature Coefficient: C0G; Object  Type: Part; Design Item ID: CC-3pF-0402-50V-±0.1pF; Series: GCM; Operating Temperature: -55°C ~ 125°C; Features: -; Ratings: AEC-Q200; Applications: Automotive; Failure Rate: -; Mounting Type: Surface Mount, MLCC; Size: 1.00mm x 0.50mm; Height: -; Thickness: 0.55mm; Category: Capacitor; Value: 3pF
footprint CC0402
pins: 1, 2

## CC-4.3pF-0402-50V-±0.1pF
designator C?, comment Voltage - Rated: 50V  Package: 0402  (hidden comment: 4.3pF)
CAP CER 4.3PF 50V C0G/NP0 0402; Manufacturer Part Number: GCM1555C1H4R3BA16D; Manufacturer: Murata Electronics; Tolerance: ±0.1pF; Temperature Coefficient: C0G; Object  Type: Part; Design Item ID: CC-4.3pF-0402-50V-±0.1pF; Series: GCM; Operating Temperature: -55°C ~ 125°C; Features: -; Ratings: AEC-Q200; Applications: Automotive; Failure Rate: -; Mounting Type: Surface Mount, MLCC; Size: 1.00mm x 0.50mm; Height: -; Thickness: 0.55mm; Category: Capacitor; Value: 4.3pF
footprint CC0402
pins: 1, 2

## CC-4.7nF-0402-100V-±10%
designator C?, comment Voltage - Rated: 100V  Package: 0402  (hidden comment: 4.7nF)
CAP CER 4700PF 100V X7R 0402; Manufacturer Part Number: GCM155R72A472KA37D; Manufacturer: Murata Electronics; Tolerance: ±10%; Temperature Coefficient: C0G; Object  Type: Part; Design Item ID: CC-4.7nF-0402-100V-±10%; Series: GCM; Operating Temperature: -55°C ~ 125°C; Features: -; Ratings: AEC-Q200; Applications: Automotive; Failure Rate: -; Mounting Type: Surface Mount, MLCC; Size: 1.00mm x 0.50mm; Height: -; Thickness: 0.55mm; Category: Capacitor; Value: 4.7nF
footprint CC0402
pins: 1, 2

## CC-4.7pF-0402-50V-±0.1pF
designator C?, comment Voltage - Rated: 50V  Package: 0402  (hidden comment: 4.7pF)
CAP CER 4.7PF 50V C0G/NP0 0402; Manufacturer Part Number: GCM1555C1H4R7BA16D; Manufacturer: Murata Electronics; Tolerance: ±0.1pF; Temperature Coefficient: C0G; Object  Type: Part; Design Item ID: CC-4.7pF-0402-50V-±0.1pF; Series: GCM; Operating Temperature: -55°C ~ 125°C; Features: -; Ratings: AEC-Q200; Applications: Automotive; Failure Rate: -; Mounting Type: Surface Mount, MLCC; Size: 1.00mm x 0.50mm; Height: -; Thickness: 0.55mm; Category: Capacitor; Value: 4.7pF
footprint CC0402
pins: 1, 2

## CC-4.7µF-0402-6.3V-±20%
designator C?, comment Voltage - Rated: 6.3V  Package: 0402  (hidden comment: 4.7µF)
CAP CER 4.7UF 6.3V X5R 0402; Manufacturer Part Number: JMK105BBJ475MVHF; Manufacturer: Taiyo Yuden; Tolerance: ±20%; Temperature Coefficient: C0G; Object  Type: Part; Design Item ID: CC-4.7µF-0402-6.3V-±20%; Series: M; Operating Temperature: -55°C ~ 85°C; Features: -; Ratings: AEC-Q200; Applications: Automotive; Failure Rate: -; Mounting Type: Surface Mount, MLCC; Size: 1.00mm x 0.50mm; Height: -; Thickness: 0.65mm; Category: Capacitor; Value: 4.7µF
footprint CC0402
pins: 1, 2

## CC-4.7µF-0603-6.3V-±10%
designator C?, comment Voltage - Rated: 6.3V  Package: 0603  (hidden comment: 4.7µF)
CAP CER 4.7UF 6.3V X5R 0603; Manufacturer Part Number: JMK107BJ475KAHT; Manufacturer: Taiyo Yuden; Tolerance: ±10%; Object  Type: Part; Design Item ID: CC-4.7µF-0603-6.3V-±10%; Series: M; Temperature Coefficient: X5R; Operating Temperature: -55°C ~ 85°C; Features: -; Ratings: AEC-Q200; Applications: Automotive; Failure Rate: -; Mounting Type: Surface Mount, MLCC; Size: 1.60mm x 0.80mm; Height: -; Thickness: 0.90mm; Category: Capacitor; Value: 4.7µF
footprint CC0603
pins: 1, 2

## CC-4.7µF-0603-10V-±10%
designator C?, comment Voltage - Rated: 10V  Package: 0603  (hidden comment: 4.7µF)
CAP CER 4.7UF 10V X5R 0603; Manufacturer Part Number: LMK107BJ475KAHT; Manufacturer: Taiyo Yuden; Tolerance: ±10%; Object  Type: Part; Design Item ID: CC-4.7µF-0603-10V-±10%; Series: M; Temperature Coefficient: X5R; Operating Temperature: -55°C ~ 85°C; Features: -; Ratings: AEC-Q200; Applications: Automotive; Failure Rate: -; Mounting Type: Surface Mount, MLCC; Size: 1.60mm x 0.80mm; Height: -; Thickness: 0.90mm; Category: Capacitor; Value: 4.7µF
footprint CC0603
pins: 1, 2

## CC-4.7µF-0603-16V-±10%
designator C?, comment Voltage - Rated: 16V  Package: 0603  (hidden comment: 4.7µF)
CAP CER 4.7UF 16V X5R 0603; Manufacturer Part Number: EMK107BBJ475KAHT; Manufacturer: Taiyo Yuden; Tolerance: ±10%; Object  Type: Part; Design Item ID: CC-4.7µF-0603-16V-±10%; Series: M; Temperature Coefficient: X5R; Operating Temperature: -55°C ~ 85°C; Features: -; Ratings: AEC-Q200; Applications: Automotive; Failure Rate: -; Mounting Type: Surface Mount, MLCC; Size: 1.60mm x 0.80mm; Height: -; Thickness: 0.90mm; Category: Capacitor; Value: 4.7µF
footprint CC0603
pins: 1, 2

## CC-4.7µF-1206-50V-±10%
designator C?, comment Voltage - Rated: 50V  Package: 1206  (hidden comment: 4.7µF)
CAP CER 4.7UF 50V X7R 1206; Manufacturer Part Number: CNA5L1X7R1H475K160AE; Manufacturer: TDK Corporation; Tolerance: ±10%; Object  Type: Part; Design Item ID: CC-4.7µF-1206-50V-±10%; Series: CNA; Temperature Coefficient: X7R; Operating Temperature: -55°C ~ 125°C; Features: Soft Termination; Ratings: AEC-Q200; Applications: Automotive, Boardflex Sensitive; Failure Rate: -; Mounting Type: Surface Mount, MLCC; Size: 3.20mm x 1.60mm; Height: -; Thickness: 1.90mm; Category: Capacitor; Value: 4.7µF
footprint CC1206
pins: 1, 2

## CC-4pF-0402-50V-±0.1pF
designator C?, comment Voltage - Rated: 50V  Package: 0402  (hidden comment: 4pF)
CAP CER 4PF 50V C0G/NP0 0402; Manufacturer Part Number: GCM1555C1H4R0BA16D; Manufacturer: Murata Electronics; Tolerance: ±0.1pF; Temperature Coefficient: C0G; Object  Type: Part; Design Item ID: CC-4pF-0402-50V-±0.1pF; Series: GCM; Value: 4pF; Operating Temperature: -55°C ~ 125°C; Features: -; Ratings: AEC-Q200; Applications: Automotive; Failure Rate: -; Mounting Type: Surface Mount, MLCC; Size: 1.00mm x 0.50mm; Height: -; Thickness: 0.55mm; Category: Capacitor
footprint CC0402
pins: 1, 2

## CC-5.6pF-0402-50V-±0.1pF
designator C?, comment Voltage - Rated: 50V  Package: 0402  (hidden comment: 5.6pF)
CAP CER 5.6PF 50V C0G/NP0 0402; Manufacturer Part Number: GCM1555C1H5R6BA16D; Manufacturer: Murata Electronics; Tolerance: ±0.1pF; Temperature Coefficient: C0G; Object  Type: Part; Design Item ID: CC-5.6pF-0402-50V-±0.1pF; Series: GCM; Operating Temperature: -55°C ~ 125°C; Features: -; Ratings: AEC-Q200; Applications: Automotive; Failure Rate: -; Mounting Type: Surface Mount, MLCC; Size: 1.00mm x 0.50mm; Height: -; Thickness: 0.55mm; Category: Capacitor; Value: 5.6pF
footprint CC0402
pins: 1, 2

## CC-5pF-0402-50V-±0.1pF
designator C?, comment Voltage - Rated: 50V  Package: 0402  (hidden comment: 5pF)